# Altium footprint library ref-packages-longpad.PCBLIB: 1527 footprints (part 55 of 103)
Each footprint in its own frame and in the unit in brackets; x right, y up, seen from the top. Pads: shape width x height; smd on the part's side, far side on the other; paste and mask are expansions set on the pad; w line width, h text height; cw(c..) or ccw(c..) is an arc to the next point about the centre after c.
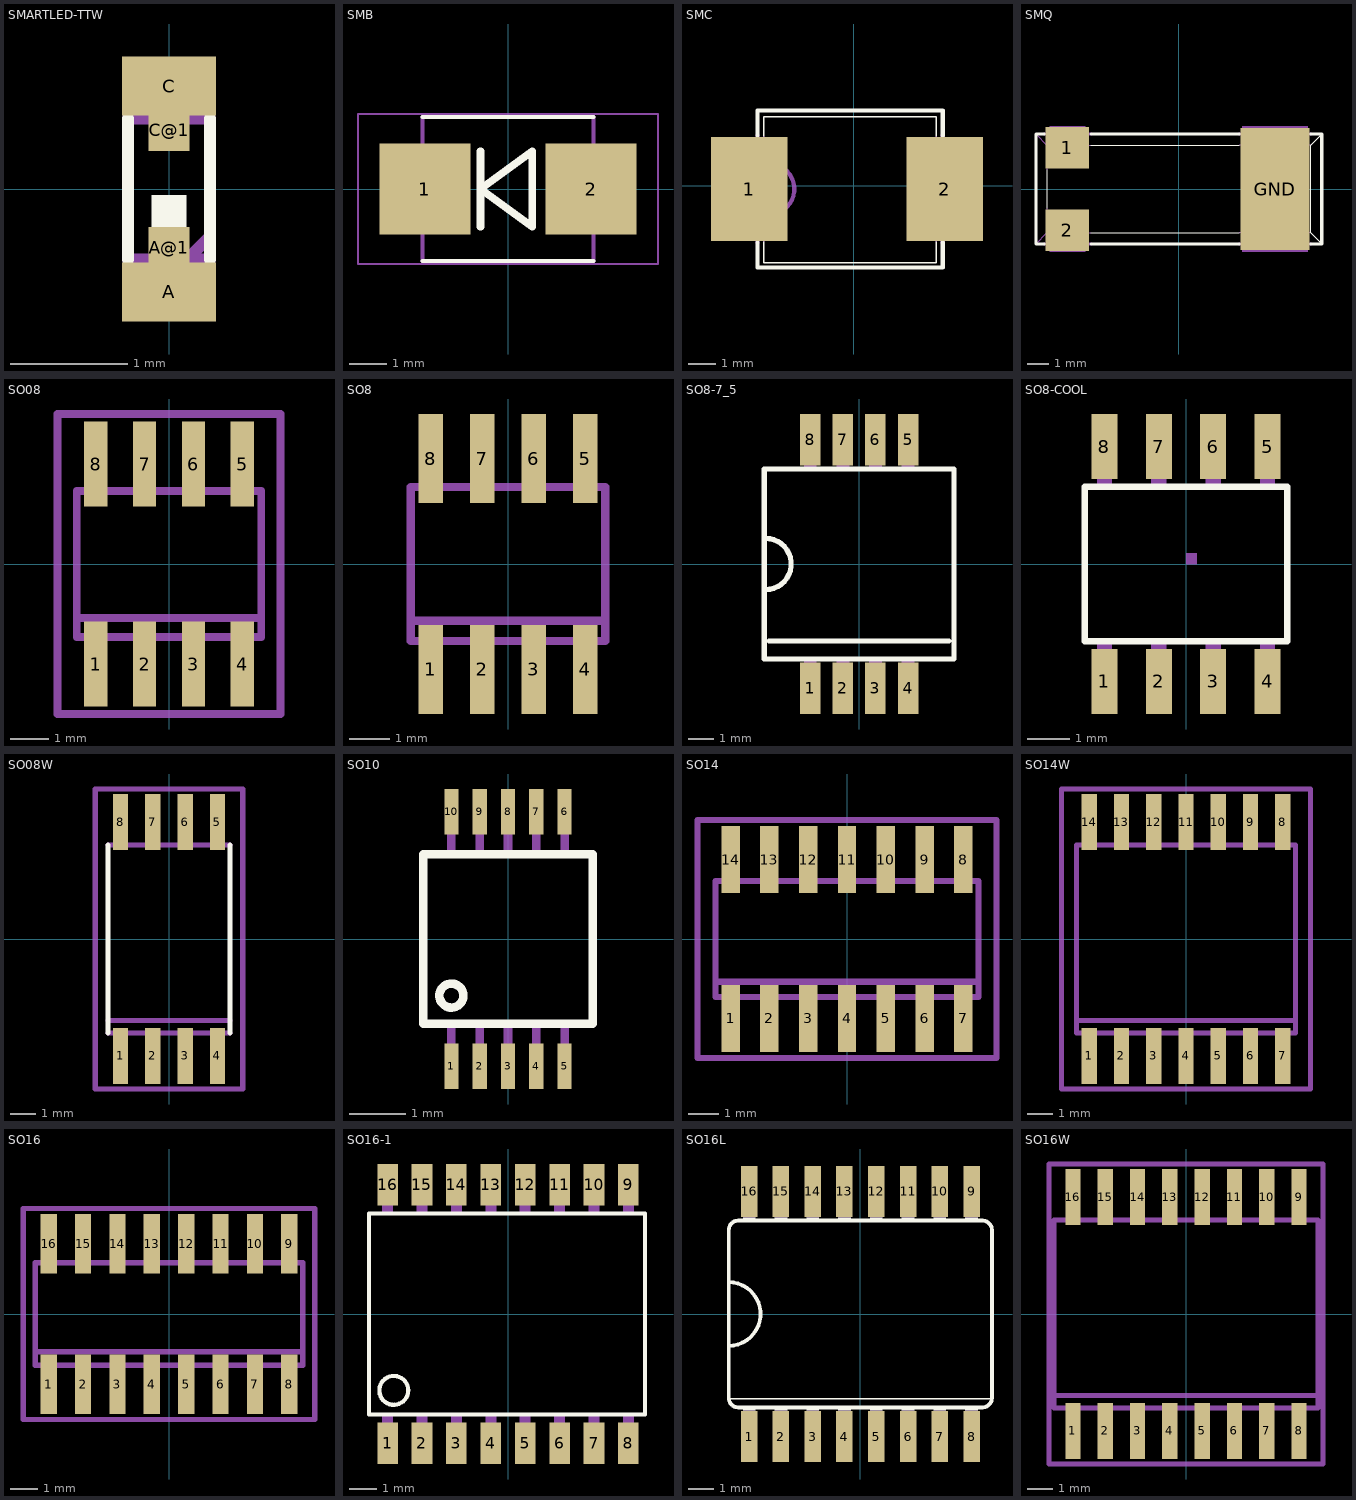
[diagram p54: the footprints below, top view; thin cyan lines are the x and y axes]

## SMARTLED-TTW [mm]
pads (4):
  rect 0.8x0.5 smd: A(0,-0.875) C(0,0.875)
  rect 0.35x0.35 smd: A@1(0,-0.5) C@1(0,0.5)
Top Overlay:
  rectangle: -0.15,-0.35 0.15,-0.05
  lines w0.102: -0.35,-0.6 -0.35,0.6 ; 0.35,-0.6 0.35,0.6
Top Solder:
  rectangle: -0.175,0.325 0.175,0.7
  rectangle: -0.4,0.625 0.4,1.125
  rectangle: -0.4,-1.125 0.4,-0.625
  rectangle: -0.175,-0.675 0.175,-0.325
Mechanical 16:
  rectangle: -0.15,0.6 0.15,0.85
  rectangle: -0.15,-0.85 0.15,-0.6
  lines w0.102: -0.35,-0.6 0.15,-0.6 ; -0.35,0.6 0.35,0.6 ; 0.35,-0.6 0.15,-0.6 ; 0.35,-0.4 0.15,-0.6

## SMB [mil]
pads (2):
  rect 94.49x94.49 smd: 1(-86.61,0) 2(86.61,0)
Top Overlay:
  lines w4: -89,-75 89,-75 ; -89,75 89,75
  lines w8: -28.74,-39.37 -28.74,39.37 ; -28.74,0 25.32,39.37 25.32,-39.37 -28.74,0
Mechanical 16:
  rectangle: -110,-43 -89,43
  rectangle: 89,-43 110,43
  lines w4: -89.02,-75 -89.02,75 ; 89.02,-75 89.02,75
Mechanical 27:
  lines w2: -156.42,-78.07 156.42,-78.07 156.42,78.07 -156.42,78.07 -156.42,-78.07

## SMC [mil]
pads (2):
  rect 110x150 smd: 1(-150,-5) 2(131,-5)
Top Overlay:
  lines w2: -129,-81 -129,-111 119,-111 119,-81 ; -129,71 -129,99 119,99 119,71
  lines w6: -138,-82 -138,-118 128,-118 128,-82 ; -138,72 -138,108 128,108 128,72
Mechanical 16:
  rectangle: 130,-65 153,55
  rectangle: -163,-65 -140,55
  lines w2: -129,-81 -129,-42 ; -129,31 -129,71 ; 119,-81 119,71
  lines w6: -138,-82 -138,-39 ; -138,29 -138,72 ; -136.48,-38.82 ccw(c-122,-5.02) -136,28.98 ; 128,-82 128,72

## SMQ [mil]
pads (3):
  rect 79x75 smd: 1(-203,75) 2(-203,-75)
  rect 126x222 smd: GND(175,0)
Top Overlay:
  lines w2: -240,-35 -240,35 ; -160,-80 110,-80 ; -160,80 110,80 ; 260,-100 240,-80 240,80 260,100
  lines w6: -245,-100 -260,-100 -260,100 -245,100 ; -160,-100 110,-100 ; -160,100 110,100 ; 240,-100 260,-100 260,100 240,100
Mechanical 16:
  rectangle: 115,100 235,115
  rectangle: 115,-115 235,-100
  rectangle: -235,-115 -170,-100
  rectangle: -235,100 -170,115
  lines w2: -260,-100 -240,-80 ; -260,100 -240,80 ; -240,-35 -240,-80 ; -240,35 -240,80 ; -160,-80 -240,-80 ; -160,80 -240,80 ; 110,-80 240,-80 ; 110,80 240,80
  lines w6: -245,-100 -160,-100 ; -245,100 -160,100 ; 110,-100 240,-100 ; 110,100 240,100

## SO08 [mil]
pads (8):
  rect 23.62x86.61 smd: 1(-75,-102.36) 2(-25,-102.36) 3(25,-102.36) 4(75,-102.36) 5(75,102.36) 6(25,102.36) 7(-25,102.36) 8(-75,102.36)
Mechanical 16:
  rectangle: -84.65,-122.05 -65.35,-78.74
  rectangle: -34.65,-122.05 -15.35,-78.74
  rectangle: 15.35,-122.05 34.65,-78.74
  rectangle: 65.35,-122.05 84.65,-78.74
  rectangle: 65.35,78.74 84.65,122.05
  rectangle: 15.35,78.74 34.65,122.05
  rectangle: -34.65,78.74 -15.35,122.05
  rectangle: -84.65,78.74 -65.35,122.05
  lines w8: -94.49,-55.12 -94.49,-74.8 94.49,-74.8 94.49,-55.12 ; -94.49,-55.12 -94.49,74.8 94.49,74.8 94.49,-55.12 ; -94.49,-55.12 94.49,-55.12
Mechanical 27:
  lines w7.87: -114.17,-153.54 114.17,-153.54 114.17,153.54 -114.17,153.54 -114.17,-153.54

## SO8 [mil]
pads (8):
  rect 23.62x86.61 smd: 1(-75,-102.36) 2(-25,-102.36) 3(25,-102.36) 4(75,-102.36) 5(75,102.36) 6(25,102.36) 7(-25,102.36) 8(-75,102.36)
Mechanical 16:
  rectangle: -84.65,-122.05 -65.35,-78.74
  rectangle: -34.65,-122.05 -15.35,-78.74
  rectangle: 15.35,-122.05 34.65,-78.74
  rectangle: 65.35,-122.05 84.65,-78.74
  rectangle: 65.35,78.74 84.65,122.05
  rectangle: 15.35,78.74 34.65,122.05
  rectangle: -34.65,78.74 -15.35,122.05
  rectangle: -84.65,78.74 -65.35,122.05
  lines w8: -94.49,-55.12 -94.49,-74.8 94.49,-74.8 94.49,-55.12 ; -94.49,-55.12 -94.49,74.8 94.49,74.8 94.49,-55.12 ; -94.49,-55.12 94.49,-55.12

## SO8-7_5 [mil]
pads (8):
  rect 31.5x78.74 smd: 1(-75,-190.75) 2(-25,-190.75) 3(25,-190.75) 4(75,-190.75) 5(75,190.75) 6(25,190.75) 7(-25,190.75) 8(-75,190.75)
Top Overlay:
  lines w8: -143.64,-39.37 ccw(c-143.64,0) -143.64,39.37 ; -137.8,-118.11 137.8,-118.11 ; -145.67,-145.67 145.67,-145.67 145.67,145.67 -145.67,145.67 -145.67,-145.67
Mechanical 16:
  rectangle: -84.84,-208.66 -65.16,-147.64
  rectangle: -34.84,-208.66 -15.16,-147.64
  rectangle: 15.16,-208.66 34.84,-147.64
  rectangle: 65.16,-208.66 84.84,-147.64
  rectangle: 65.16,147.64 84.84,208.66
  rectangle: 15.16,147.64 34.84,208.66
  rectangle: -34.84,147.64 -15.16,208.66
  rectangle: -84.84,147.64 -65.16,208.66

## SO8-COOL [mil]
pads (8):
  rect 24x60 smd: 1(-75,-108) 2(-25,-108) 3(25,-108) 4(75,-108) 5(75,108) 6(25,108) 7(-25,108) 8(-75,108)
Top Overlay:
  lines w6: -92.99,-70.98 92.99,-70.98 92.99,70.98 -92.99,70.98 -92.99,-70.98
Mechanical 16:
  rectangle: -82,-113 -68,-73
  rectangle: -32,-113 -18,-73
  rectangle: 18,-113 32,-73
  rectangle: 68,-113 82,-73
  rectangle: -82,73 -68,113
  rectangle: -32,73 -18,113
  rectangle: 18,73 32,113
  rectangle: 68,73 82,113
  region: 0,0 10,0 10,10 0,10

## SO08W [mil]
pads (8):
  rect 23.62x86.61 smd: 1(-75,-181.1) 2(-25,-181.1) 3(25,-181.1) 4(75,-181.1) 5(75,181.1) 6(25,181.1) 7(-25,181.1) 8(-75,181.1)
Top Overlay:
  lines w8: -94.49,-145.67 -94.49,145.67 ; 94.49,-145.67 94.49,145.67
Mechanical 16:
  rectangle: -84.65,-209.45 -65.35,-149.61
  rectangle: -34.65,-209.45 -15.35,-149.61
  rectangle: 15.35,-209.45 34.65,-149.61
  rectangle: 65.35,-209.45 84.65,-149.61
  rectangle: 65.35,149.61 84.65,209.45
  rectangle: 15.35,149.61 34.65,209.45
  rectangle: -34.65,149.61 -15.35,209.45
  rectangle: -84.65,149.61 -65.35,209.45
  lines w8: -94.49,-145.67 94.49,-145.67 ; -94.49,-125.98 94.49,-125.98 ; -94.49,145.67 94.49,145.67
Mechanical 27:
  lines w7.87: -114.17,-232.28 114.17,-232.28 114.17,232.28 -114.17,232.28 -114.17,-232.28

## SO10 [mil]
pads (10):
  rect 9.84x31.5 smd: 1(-39.37,-88.58) 2(-19.69,-88.58) 3(0,-88.58) 4(19.69,-88.58) 5(39.37,-88.58) 6(39.37,88.58) 7(19.69,88.58) 8(0,88.58) 9(-19.69,88.58) 10(-39.37,88.58)
Top Overlay:
  circle w6: c-39.37,-39.37 r8.35
  lines w6: -59.06,-59.06 59.06,-59.06 59.06,59.06 -59.06,59.06 -59.06,-59.06
Mechanical 16:
  rectangle: -42.37,-99 -36.37,-60
  rectangle: -22.69,-99 -16.69,-60
  rectangle: -3,-99 3,-60
  rectangle: 16.69,-99 22.69,-60
  rectangle: 36.37,-99 42.37,-60
  rectangle: 36.37,60 42.37,99
  rectangle: 16.69,60 22.69,99
  rectangle: -3,60 3,99
  rectangle: -22.69,60 -16.69,99
  rectangle: -42.37,60 -36.37,99

## SO14 [mil]
pads (14):
  rect 23.62x86.61 smd: 1(-150,-102.36) 2(-100,-102.36) 3(-50,-102.36) 4(0,-102.36) 5(50,-102.36) 6(100,-102.36) 7(150,-102.36) 8(150,102.36) 9(100,102.36) 10(50,102.36) 11(0,102.36) 12(-50,102.36) 13(-100,102.36) 14(-150,102.36)
Mechanical 16:
  rectangle: -159.65,-122.05 -140.35,-78.74
  rectangle: -109.65,-122.05 -90.35,-78.74
  rectangle: -59.65,-122.05 -40.35,-78.74
  rectangle: -9.65,-122.05 9.65,-78.74
  rectangle: -9.65,78.74 9.65,122.05
  rectangle: -59.65,78.74 -40.35,122.05
  rectangle: -109.65,78.74 -90.35,122.05
  rectangle: -159.65,78.74 -140.35,122.05
  rectangle: 40.35,-122.05 59.65,-78.74
  rectangle: 90.35,-122.05 109.65,-78.74
  rectangle: 140.35,-122.05 159.65,-78.74
  rectangle: 140.35,78.74 159.65,122.05
  rectangle: 90.35,78.74 109.65,122.05
  rectangle: 40.35,78.74 59.65,122.05
  lines w8: -169.49,-55.12 -169.49,-74.8 169.49,-74.8 169.49,-55.12 ; -169.49,-55.12 -169.49,74.8 169.49,74.8 169.49,-55.12 ; -169.49,-55.12 169.49,-55.12
Mechanical 27:
  lines w7.87: -192.72,-153.54 192.72,-153.54 192.72,153.54 -192.72,153.54 -192.72,-153.54

## SO14W [mil]
pads (14):
  rect 23.62x86.61 smd: 1(-150,-181.1) 2(-100,-181.1) 3(-50,-181.1) 4(0,-181.1) 5(50,-181.1) 6(100,-181.1) 7(150,-181.1) 8(150,181.1) 9(100,181.1) 10(50,181.1) 11(0,181.1) 12(-50,181.1) 13(-100,181.1) 14(-150,181.1)
Mechanical 16:
  rectangle: -159.65,-209.45 -140.35,-149.61
  rectangle: -109.65,-209.45 -90.35,-149.61
  rectangle: -59.65,-209.45 -40.35,-149.61
  rectangle: -9.65,-209.45 9.65,-149.61
  rectangle: 40.35,-209.45 59.65,-149.61
  rectangle: 90.35,-209.45 109.65,-149.61
  rectangle: 140.35,-209.45 159.65,-149.61
  rectangle: 140.35,149.61 159.65,209.45
  rectangle: 90.35,149.61 109.65,209.45
  rectangle: 40.35,149.61 59.65,209.45
  rectangle: -9.65,149.61 9.65,209.45
  rectangle: -59.65,149.61 -40.35,209.45
  rectangle: -109.65,149.61 -90.35,209.45
  rectangle: -159.65,149.61 -140.35,209.45
  lines w8: -169.49,-125.98 -169.49,-145.67 169.49,-145.67 169.49,-125.98 ; -169.49,-125.98 -169.49,145.67 169.49,145.67 169.49,-125.98 ; -169.49,-125.98 169.49,-125.98
Mechanical 27:
  lines w7.87: -192.72,-232.28 192.72,-232.28 192.72,232.28 -192.72,232.28 -192.72,-232.28

## SO16 [mil]
pads (16):
  rect 23.62x86.61 smd: 1(-175,-102.36) 2(-125,-102.36) 3(-75,-102.36) 4(-25,-102.36) 5(25,-102.36) 6(75,-102.36) 7(125,-102.36) 8(175,-102.36) 9(175,102.36) 10(125,102.36) 11(75,102.36) 12(25,102.36) 13(-25,102.36) 14(-75,102.36) 15(-125,102.36) 16(-175,102.36)
Mechanical 16:
  rectangle: -184.65,-122.05 -165.35,-78.74
  rectangle: -134.65,-122.05 -115.35,-78.74
  rectangle: -84.65,-122.05 -65.35,-78.74
  rectangle: -34.65,-122.05 -15.35,-78.74
  rectangle: 65.35,78.74 84.65,122.05
  rectangle: 15.35,78.74 34.65,122.05
  rectangle: -34.65,78.74 -15.35,122.05
  rectangle: -84.65,78.74 -65.35,122.05
  rectangle: 15.35,-122.05 34.65,-78.74
  rectangle: 65.35,-122.05 84.65,-78.74
  rectangle: 115.35,-122.05 134.65,-78.74
  rectangle: 165.35,-122.05 184.65,-78.74
  rectangle: 165.35,78.74 184.65,122.05
  rectangle: 115.35,78.74 134.65,122.05
  rectangle: -134.65,78.74 -115.35,122.05
  rectangle: -184.65,78.74 -165.35,122.05
  lines w8: -194.49,-55.12 -194.49,-74.8 194.49,-74.8 194.49,-55.12 ; -194.49,-55.12 -194.49,74.8 194.49,74.8 194.49,-55.12 ; -194.49,-55.12 194.49,-55.12
Mechanical 27:
  lines w7.87: -212.4,-153.54 212.4,-153.54 212.4,153.54 -212.4,153.54 -212.4,-153.54

## SO16-1 [mil]
pads (16):
  rect 30x60 smd: 1(-175,-188) 2(-125,-188) 3(-75,-188) 4(-25,-188) 5(25,-188) 6(75,-188) 7(125,-188) 8(175,-188) 9(175,188) 10(125,188) 11(75,188) 12(25,188) 13(-25,188) 14(-75,188) 15(-125,188) 16(-175,188)
Top Overlay:
  circle w6: c-166,-111 r21
  lines w6: -202,-146 199,-146 199,146 -202,146 -202,-146
Mechanical 16:
  rectangle: 167,148 183,200
  rectangle: 117,148 133,200
  rectangle: 67,148 83,200
  rectangle: 17,148 33,200
  rectangle: -33,148 -17,200
  rectangle: -83,148 -67,200
  rectangle: -133,148 -117,200
  rectangle: -183,148 -167,200
  rectangle: 167,-200 183,-148
  rectangle: 117,-200 133,-148
  rectangle: 67,-200 83,-148
  rectangle: 17,-200 33,-148
  rectangle: -33,-200 -17,-148
  rectangle: -83,-200 -67,-148
  rectangle: -133,-200 -117,-148
  rectangle: -183,-200 -167,-148

## SO16L [mil]
pads (16):
  rect 26x80 smd: 1(-175,-193) 2(-125,-193) 3(-75,-193) 4(-25,-193) 5(25,-193) 6(75,-193) 7(125,-193) 8(175,-193) 9(175,193) 10(125,193) 11(75,193) 12(25,193) 13(-25,193) 14(-75,193) 15(-125,193) 16(-175,193)
Top Overlay:
  rectangle: -185,-152 -165,-147
  rectangle: -135,-152 -115,-147
  rectangle: -85,-152 -65,-147
  rectangle: -35,-152 -15,-147
  rectangle: 15,-152 35,-147
  rectangle: 65,-152 85,-147
  rectangle: 115,-152 135,-147
  rectangle: 165,-152 185,-147
  rectangle: -185,147 -165,152
  rectangle: -135,147 -115,152
  rectangle: -85,147 -65,152
  rectangle: -35,147 -15,152
  rectangle: 15,147 35,152
  rectangle: 65,147 85,152
  rectangle: 115,147 135,152
  rectangle: 165,147 185,152
  lines w2: -205,-133 206,-133
  lines w6: -207,-50 -207,50 ; -207,-50 -207,-132 ccw(c-192,-132) -192,-147 192,-147 ccw(c192,-132) 207,-132 207,132 ccw(c192,132) 192,147 -192,147 ccw(c-192,132) -207,132 -207,50 ; -207,-50 ccw(c-207,0) -207,50
Mechanical 16:
  rectangle: -185,-210 -165,-152
  rectangle: -135,-210 -115,-152
  rectangle: -85,-210 -65,-152
  rectangle: -35,-210 -15,-152
  rectangle: 15,-210 35,-152
  rectangle: 65,-210 85,-152
  rectangle: 115,-210 135,-152
  rectangle: 165,-210 185,-152
  rectangle: -185,152 -165,210
  rectangle: -135,152 -115,210
  rectangle: -85,152 -65,210
  rectangle: -35,152 -15,210
  rectangle: 15,152 35,210
  rectangle: 65,152 85,210
  rectangle: 115,152 135,210
  rectangle: 165,152 185,210

## SO16W [mil]
pads (16):
  rect 23.62x86.61 smd: 1(-175,-181.1) 2(-125,-181.1) 3(-75,-181.1) 4(-25,-181.1) 5(25,-181.1) 6(75,-181.1) 7(125,-181.1) 8(175,-181.1) 9(175,181.1) 10(125,181.1) 11(75,181.1) 12(25,181.1) 13(-25,181.1) 14(-75,181.1) 15(-125,181.1) 16(-175,181.1)
Mechanical 16:
  rectangle: -184.65,-209.45 -165.35,-149.61
  rectangle: -134.65,-209.45 -115.35,-149.61
  rectangle: -84.65,-209.45 -65.35,-149.61
  rectangle: -34.65,-209.45 -15.35,-149.61
  rectangle: 15.35,-209.45 34.65,-149.61
  rectangle: 65.35,-209.45 84.65,-149.61
  rectangle: 115.35,-209.45 134.65,-149.61
  rectangle: 165.35,-209.45 184.65,-149.61
  rectangle: 165.35,149.61 184.65,209.45
  rectangle: 115.35,149.61 134.65,209.45
  rectangle: 65.35,149.61 84.65,209.45
  rectangle: 15.35,149.61 34.65,209.45
  rectangle: -34.65,149.61 -15.35,209.45
  rectangle: -84.65,149.61 -65.35,209.45
  rectangle: -134.65,149.61 -115.35,209.45
  rectangle: -184.65,149.61 -165.35,209.45
  lines w8: -204.33,-125.98 -204.33,-145.67 204.33,-145.67 204.33,-125.98 ; -204.33,-125.98 -204.33,145.67 204.33,145.67 204.33,-125.98 ; -204.33,-125.98 204.33,-125.98
Mechanical 27:
  lines w7.87: -212.4,-232.28 212.4,-232.28 212.4,232.28 -212.4,232.28 -212.4,-232.28